# Altium footprint library General.PcbLib: 128 footprints (part 4 of 8)
Each footprint in its own frame and in the unit in brackets; x right, y up, seen from the top. Pads: shape width x height; smd on the part's side, far side on the other; paste and mask are expansions set on the pad; w line width, h text height; cw(c..) or ccw(c..) is an arc to the next point about the centre after c.
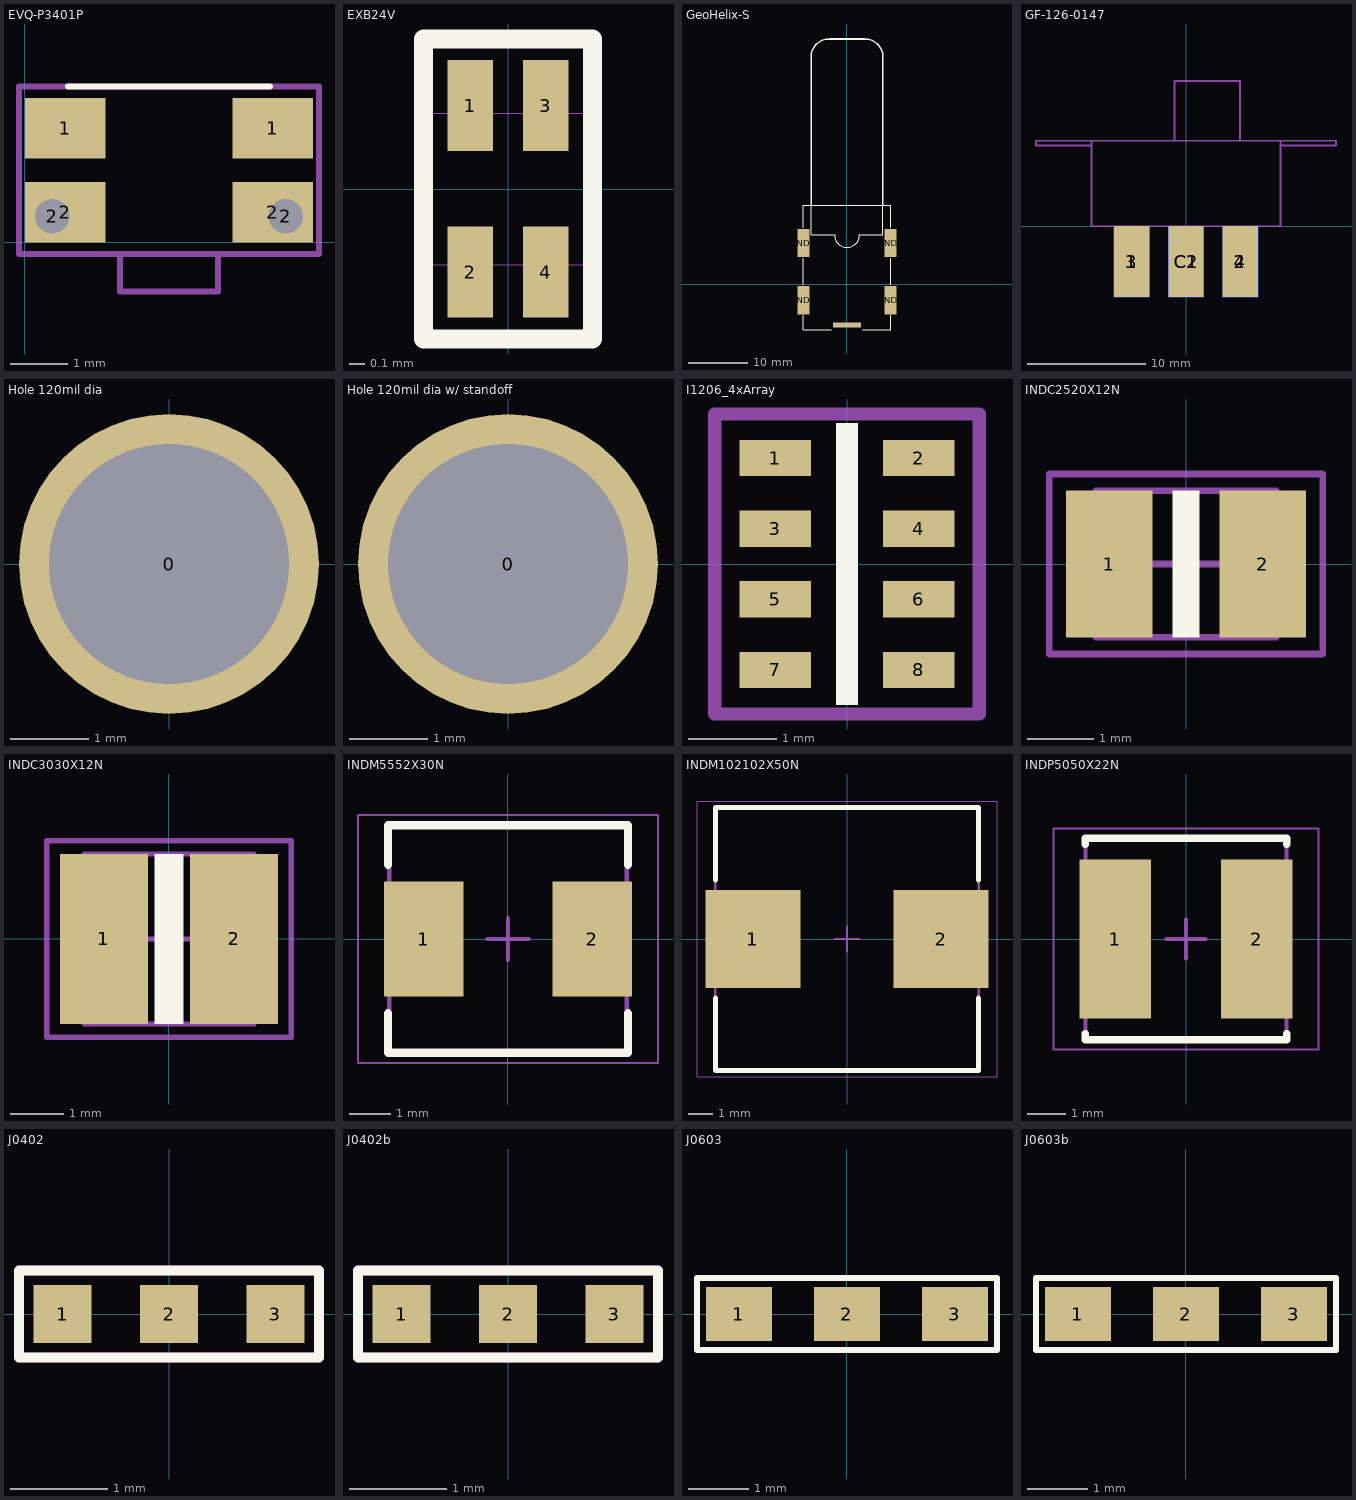
[diagram p3: the footprints below, top view; thin cyan lines are the x and y axes]

## EVQ-P3401P [mm] "SWITCH TACTILE SPST-NO 0.05A 12V"
height 1.35
pads (6):
  rect 1.4x1.05 smd: 1(0.7,1.975) 1(4.3,1.975) 2(0.7,0.525) 2(4.3,0.525)
  round 0.9 hole 0.6 mask+0: 2(0.475,0.45) 2(4.525,0.45)
Top Overlay:
  lines w0.1: 0.75,2.7 4.25,2.7
Mechanical 13:
  lines w0.1: 0.75,-0.2 4.25,-0.2 ; 1.65,-0.2 1.65,-0.85 3.35,-0.85 3.35,-0.2
Mechanical 15:
  lines w0.1: -0.1,-0.2 -0.1,2.7 5.1,2.7 5.1,-0.2 -0.1,-0.2
3D body "EVQ-9P7_P34-01P.STEP": height 1.35, standoff -0.6, extent 0.15,-0.85 4.85,2.844

## EXB24V [mm]
pads (4):
  rect 0.3x0.6 smd: 1(-0.25,0.551) 2(-0.25,-0.549) 3(0.25,0.551) 4(0.25,-0.549)
Top Overlay:
  lines w0.127: -0.559,-0.991 -0.559,0.991 0.559,0.991 0.559,-0.991 -0.559,-0.991
Mechanical 1:
  lines w0: -0.5,-0.5 0.5,-0.5 0.5,0.5 -0.5,0.5 -0.5,-0.5
3D body: height 0.35, standoff 0, extent -0.499,-0.499 0.499,0.499

## GeoHelix-S [mm] "Sarantel GPS antenna"
pads (5):
  rect 2x4.7 smd: GND1(7.303,-2.7) GND2(7.303,6.825) GND3(-7.302,6.825) GND4(-7.302,-2.7)
  rect 4.7x0.8 smd: RF_OUT(0,-6.825)
Top Overlay:
  lines w0.127: -7.29,-5.24 -7.29,-7.603 -2.66,-7.603 ; -7.29,-0.135 -7.29,4.285 ; -7.29,9.39 -7.29,13.124 ; -7.226,13.175 -5.994,13.175 ; 2.66,-7.603 7.315,-7.603 7.315,-5.24 ; 7.252,13.175 5.994,13.175 ; 7.315,-0.135 7.315,4.285 ; 7.315,9.39 7.315,13.124 ; -5.994,13.175 5.994,13.175 ; -5.994,13.175 -5.994,8.196 -2.083,8.196 ccw(c0,8.196) 2.083,8.196 5.994,8.196 5.994,13.175
  lines w0.254: -5.994,13.175 -5.994,37.912 cw(c-2.994,37.912) -2.994,40.912 2.994,40.912 cw(c2.994,37.912) 5.994,37.912 5.994,13.276

## GF-126-0147 [mm] "SWITCH SLIDE BRD EDGE DPDT 3A PC MNT"
pads (6):
  rect 3x6 smd: 1(-4.6,-3) 2(4.6,-3) C1(0,-3)
  rect 3x6 smd far side: 3(-4.6,-3) 4(4.6,-3) C2(0,-3)
Mechanical 1:
  lines w0.152: -12.7,6.83 -8.07,6.83 ; -12.7,6.85 -12.7,7.225 ; -12.7,7.24 12.7,7.24 ; -8,0 -8,7.2 ; -7.975,0 7.975,0 ; -0.97,7.3 -0.97,12.3 ; -0.9,12.3 4.5,12.3 ; 4.57,7.3 4.57,12.3 ; 8,0 8,7.2 ; 8.07,6.83 12.7,6.83 ; 12.7,6.85 12.7,7.225

## Hole 120mil dia [mil]
pads (1):
  round 150 hole 120: 0(0,0)

## Hole 120mil dia w/ standoff [mil]
pads (1):
  round 150 hole 120: 0(0,0)
3D body "91221A212.STEP": height 112.48, standoff -187.02, extent -91.5,-91.32 91.5,91.32
3D body "93330A409.STEP": height 125.48, standoff 0.48, extent -125,-124.86 125,124.86

## I1206_4xArray [mm]
pads (8):
  rect 0.81x0.41 smd: 1(-0.815,1.2) 2(0.815,1.2) 3(-0.815,0.4) 4(0.815,0.4) 5(-0.815,-0.4) 6(0.815,-0.4) 7(-0.815,-1.2) 8(0.815,-1.2)
Top Overlay:
  rectangle: -0.127,-1.6 0.127,1.6
Mechanical 15:
  lines w0.152: -1.5,-1.7 1.5,-1.7 1.5,1.7 -1.5,1.7 -1.5,-1.7
3D body "User Library-Array-1206-4Way-Var1.STEP": height 0.5, standoff 0, extent -0.8,-1.6 0.8,1.6

## INDC2520X12N [mm] "Chip Inductor, 2-Leads, Body 2.5x2.0mm, IPC Medium Density"
height 1.2
pads (2):
  rect 1.3x2.2 smd: 1(-1.15,0) 2(1.15,0)
Top Overlay:
  rectangle: -0.2,-1.1 0.2,1.1
Mechanical 13:
  lines w0.1: -1.35,-1.1 -1.35,1.1 1.35,1.1 1.35,-1.1 -1.35,-1.1
Mechanical 15:
  lines w0.1: -0.5,0 0.5,0 ; 0,-0.5 0,0.5 ; -2.05,-1.35 -2.05,1.35 2.05,1.35 2.05,-1.35 -2.05,-1.35
3D body: height 1.2, standoff 0, extent -1.35,-1.1 1.35,1.1

## INDC3030X12N [mm] "Chip Inductor, 2-Leads, Body 3.0x3.0mm, IPC Medium Density"
height 1.2
pads (2):
  rect 1.65x3.2 smd: 1(-1.225,0) 2(1.225,0)
Top Overlay:
  rectangle: -0.275,-1.6 0.275,1.6
Mechanical 13:
  lines w0.1: -1.6,-1.6 1.6,-1.6 1.6,1.6 -1.6,1.6 -1.6,-1.6
Mechanical 15:
  lines w0.1: -0.5,0 0.5,0 ; 0,-0.5 0,0.5 ; -2.3,-1.85 2.3,-1.85 2.3,1.85 -2.3,1.85 -2.3,-1.85
3D body: height 1.2, standoff 0, extent -1.6,-1.6 1.6,1.6

## INDM5552X30N [mm] "Molded Inductor, 2-Leads, Body 5.49x5.18mm, IPC Medium Density"
height 3
pads (2):
  rect 1.915x2.79 smd: 1(-2.037,0) 2(2.038,0)
Top Overlay:
  lines w0.2: -2.9,-1.795 -2.9,-2.75 2.9,-2.75 2.9,-1.795 ; -2.9,1.795 -2.9,2.75 2.9,2.75 2.9,1.795
Mechanical 13:
  lines w0.1: -2.87,-2.715 -2.87,2.715 2.87,2.715 2.87,-2.715 -2.87,-2.715
Mechanical 15:
  lines w0.05: -3.625,-3 -3.625,3 3.625,3 3.625,-3 -3.625,-3
  lines w0.1: -0.5,0 0.5,0 ; 0,-0.5 0,0.5
3D body: height 3, standoff 0, extent -2.87,-2.715 2.87,2.715

## INDM102102X50N [mm] "Molded Inductor, 2-Leads, Body 10.20x10.20mm, IPC Medium Density"
height 5
pads (2):
  rect 3.85x4 smd: 1(-3.825,0) 2(3.825,0)
Top Overlay:
  lines w0.2: -5.35,-2.4 -5.35,-5.35 5.35,-5.35 5.35,-2.4 ; -5.35,2.4 -5.35,5.35 5.35,5.35 5.35,2.4
Mechanical 13:
  lines w0.1: -5.35,-5.35 -5.35,5.35 5.35,5.35 5.35,-5.35 -5.35,-5.35
Mechanical 15:
  lines w0.05: -6.1,-5.6 -6.1,5.6 6.1,5.6 6.1,-5.6 -6.1,-5.6
  lines w0.1: -0.5,0 0.5,0 ; 0,-0.5 0,0.5
3D body: height 5, standoff 0, extent -5.35,-5.35 5.35,5.35

## INDP5050X22N [mm] "Precision Wire Wound Inductor, 2-Leads, Body 5.00x5.00mm, IPC Medium Density"
height 2.2
pads (2):
  rect 1.85x4.1 smd: 1(-1.825,0) 2(1.825,0)
Top Overlay:
  lines w0.2: -2.6,-2.45 -2.6,-2.6 2.6,-2.6 2.6,-2.45 ; -2.6,2.45 -2.6,2.6 2.6,2.6 2.6,2.45
Mechanical 13:
  lines w0.1: -2.6,-2.6 -2.6,2.6 2.6,2.6 2.6,-2.6 -2.6,-2.6
Mechanical 15:
  lines w0.05: -3.425,-2.85 -3.425,2.85 3.425,2.85 3.425,-2.85 -3.425,-2.85
  lines w0.1: -0.5,0 0.5,0 ; 0,-0.5 0,0.5
3D body: height 2.2, standoff 0, extent -2.6,-2.6 2.6,2.6

## J0402 [mm] "Jumper"
pads (3):
  rect 0.6x0.6 smd: 1(-1.1,0) 2(0,0) 3(1.1,0)
Top Overlay:
  lines w0.1: -1.55,-0.45 -1.55,0.45 1.55,0.45 1.55,-0.45 -1.55,-0.45
Mechanical 15:
  lines w0.1: -1.55,-0.45 -1.55,0.45 1.55,0.45 1.55,-0.45 -1.55,-0.45
3D body "SW3dPS-0402 SMD Resistor.step": height 0.2, standoff 0, extent -1.06,-0.3 -0.06,0.3

## J0402b [mm] "Jumper - Pos 2"
pads (3):
  rect 0.6x0.6 smd: 1(-1.1,0) 2(0,0) 3(1.1,0)
Top Overlay:
  lines w0.1: -1.55,-0.45 1.55,-0.45 1.55,0.45 -1.55,0.45 -1.55,-0.45
Mechanical 15:
  lines w0.1: -1.55,-0.45 1.55,-0.45 1.55,0.45 -1.55,0.45 -1.55,-0.45
3D body "SW3dPS-0402 SMD Resistor.step": height 0.2, standoff 0, extent 0.06,-0.3 1.06,0.3

## J0603 [mm] "Jumper"
pads (3):
  rect 1.1x0.9 smd: 1(-1.8,0) 2(0,0) 3(1.8,0)
Top Overlay:
  lines w0.1: -2.5,-0.6 2.5,-0.6 2.5,0.6 -2.5,0.6 -2.5,-0.6
Mechanical 15:
  lines w0.1: -2.5,-0.6 2.5,-0.6 2.5,0.6 -2.5,0.6 -2.5,-0.6
3D body "SW3dPS-0603 SMD Resistor.step": height 0.3, standoff 0, extent -1.7,-0.4 -0.1,0.4

## J0603b [mm] "Jumper - Pos 2"
pads (3):
  rect 1.1x0.9 smd: 1(-1.8,0) 2(0,0) 3(1.8,0)
Top Overlay:
  lines w0.1: -2.5,-0.6 -2.5,0.6 2.5,0.6 2.5,-0.6 -2.5,-0.6
Mechanical 15:
  lines w0.1: -2.5,-0.6 -2.5,0.6 2.5,0.6 2.5,-0.6 -2.5,-0.6
3D body "SW3dPS-0603 SMD Resistor.step": height 0.3, standoff 0, extent 0.1,-0.4 1.7,0.4